# Altium footprint library DrPCB.PcbLib: 910 footprints (part 22 of 57)
Each footprint in its own frame and in the unit in brackets; x right, y up, seen from the top. Pads: shape width x height; smd on the part's side, far side on the other; paste and mask are expansions set on the pad; w line width, h text height; cw(c..) or ccw(c..) is an arc to the next point about the centre after c.
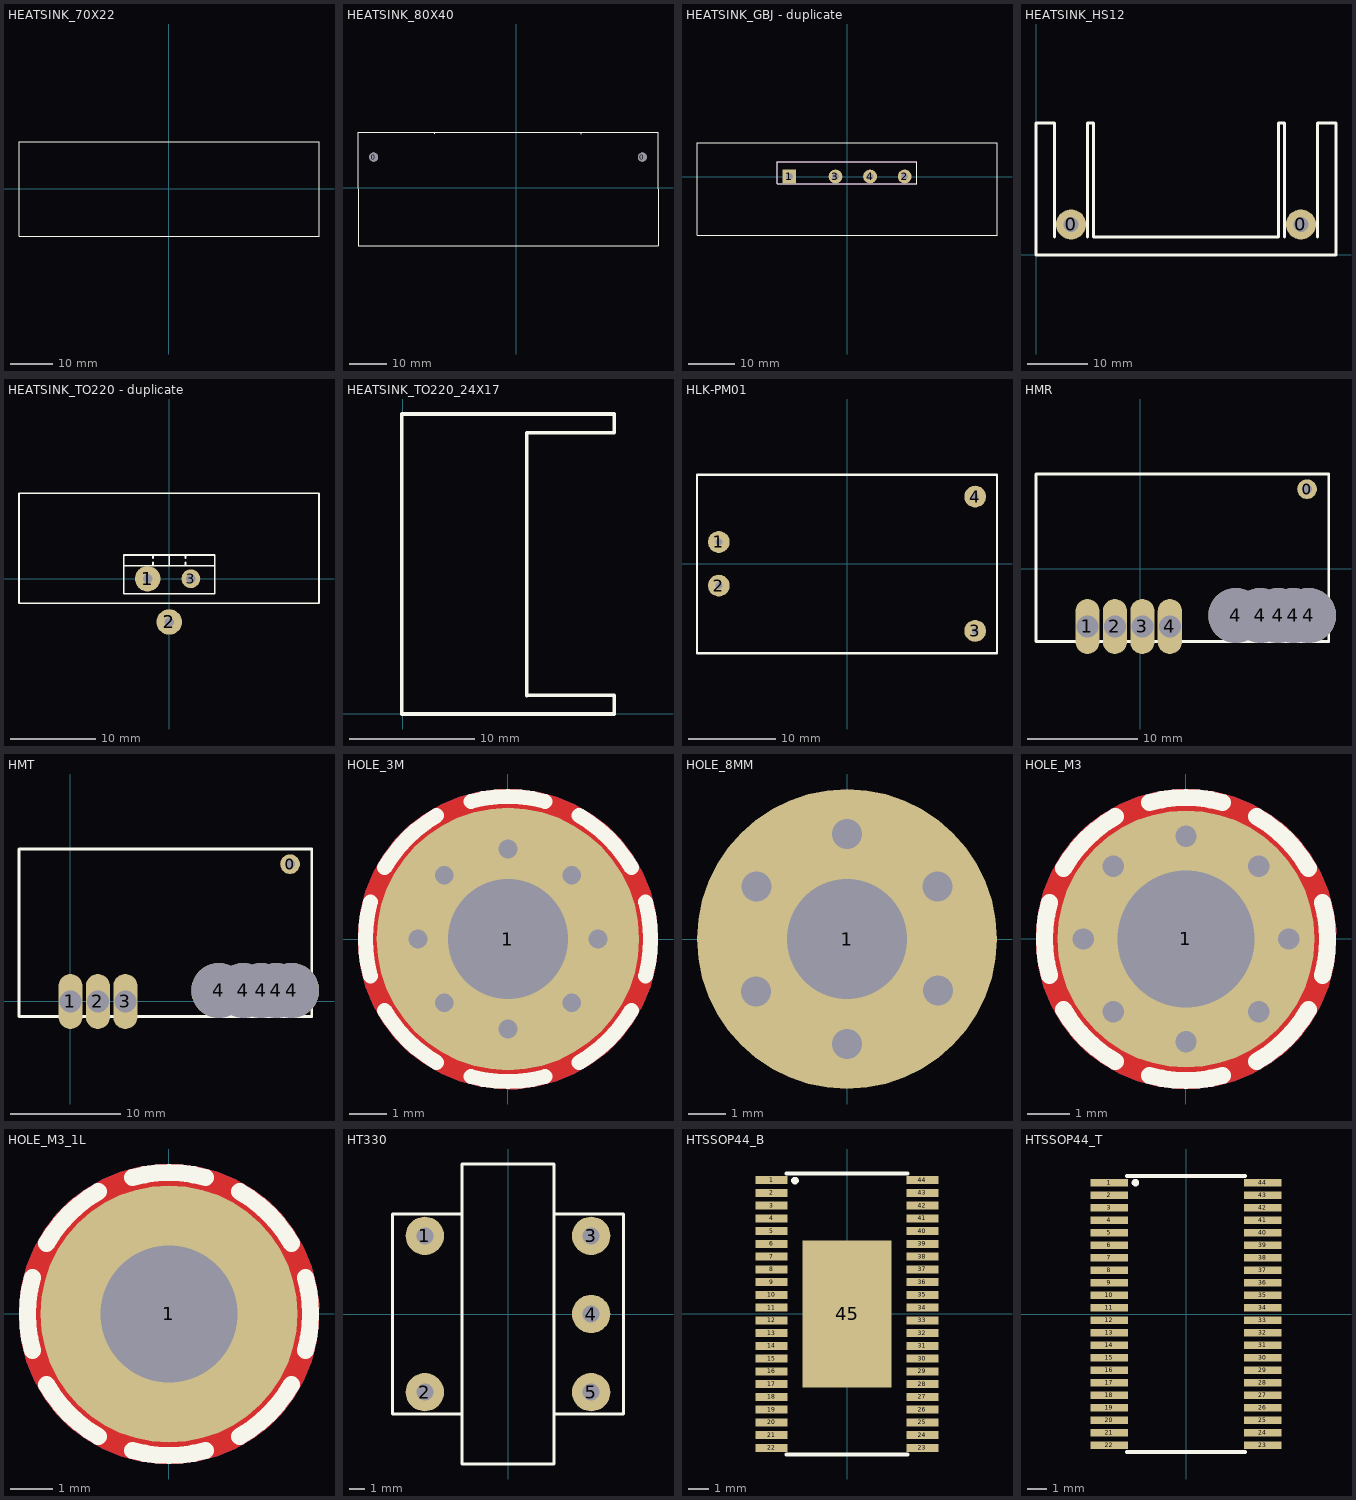
[diagram p21: the footprints below, top view; thin cyan lines are the x and y axes]

## HEATSINK_70X22 [mm]
Top Overlay:
  lines w0.15: -35,-11 35,-11 35,11 -35,11 -35,-11
3D body "Heatsink.STEP": height 4.7, standoff 1.5, extent -35,-11 35,11

## HEATSINK_80X40 [mm]
pads (2):
  round 2.4 hole 2.4: 0(-38.16,8.115) 0(33.642,8.115)
Top Overlay:
  lines w0.2: -42.364,-15.494 37.833,-15.494 37.833,14.719 -42.364,14.719 -42.364,-15.49 ; -21.864,14.338 -21.864,14.719 ; 17.333,14.313 17.333,14.694
3D body "Heatsink3.STEP": height 40, standoff 0, extent -42.261,-15.392 37.739,14.608

## HEATSINK_GBJ - duplicate [mm]
pads (4):
  rect 3x3 hole 1.51: 1(-12.5,0)
  round 3 hole 1.51: 2(12.5,0) 3(-2.5,0) 4(5,0)
Top Overlay:
  lines w0.127: -15.15,-1.55 15.15,-1.55 15.15,3.25 -15.15,3.25 -15.15,-1.55
  lines w0.2: -32.499,-12.7 32.499,-12.7 32.499,7.302 -32.499,7.302 -32.499,-12.7
Mechanical 13:
  lines w0.127: -15.15,-1.55 15.15,-1.55 15.15,3.25 -15.15,3.25 -15.15,-1.55
3D body "step_temp.STEP": height 24.5, standoff -13.8, extent -15,-1.45 15,3.15
3D body "parvaneii.STEP": height 30.01, standoff 0.01, extent -32.5,-12.7 32.5,7.3

## HEATSINK_HS12 [mm]
pads (2):
  round 5 hole 2.5: 0(5.85,5.1) 0(44.15,5.1)
Top Overlay:
  lines w0.5: 3.088,3 3.088,22 0,22 0,0 50,0 50,22 46.912,22 46.912,3 ; 8.611,3 8.611,22 9.611,22 9.611,3 ; 9.649,3 40.4,3 40.4,22 41.4,22 41.4,3
3D body: height 25, standoff 0, extent 0.013,0.013 49.987,22.009

## HEATSINK_TO220 - duplicate [mm]
pads (3):
  round 3 hole 1.1: 1(-2.54,0) 2(0,-5.08)
  round 2.2 hole 1.1: 3(2.54,0)
Top Overlay:
  lines w0.2: -17.645,-2.894 17.585,-2.894 17.585,10.035 -17.645,10.035 ; -17.645,-2.881 -17.645,10.022 ; -5.334,1.524 5.334,1.524 ; -1.905,1.524 -1.905,1.905 ; -1.905,2.413 -1.905,2.794 ; 0,1.524 0,2.794 ; 1.905,1.524 1.905,1.905 ; 1.905,2.413 1.905,2.794 ; -5.334,-1.778 5.334,-1.778 5.334,2.794 -5.334,2.794 -5.334,-1.778
3D body "v7477w2.stp": height 25.41, standoff -3.49, extent -17.529,-2.783 17.471,9.917
3D body "User Library-TO220-2_V-S.STEP": height 19.3, standoff -2.9, extent -5.03,-1.706 4.97,2.794

## HEATSINK_TO220_24X17 [mm]
Top Overlay:
  lines w0.3: 9.924,1.462 16.924,1.462 16.924,-0.038 -0.076,-0.038 -0.076,23.962 16.924,23.962 16.924,22.462 ; 9.929,1.448 9.929,22.428 9.963,22.462 ; 9.929,22.462 16.929,22.462
3D body "User Library-radiator_l298.STEP": height 25, standoff -4, extent 0.66,-0.037 16.66,23.963

## HLK-PM01 [mm]
pads (4):
  round 2.5 hole 0.8: 1(-14.7,2.5) 2(-14.7,-2.5) 3(14.7,-7.7) 4(14.7,7.7)
Top Overlay:
  lines w0.254: -17.2,-10.25 17.2,-10.25 17.2,10.15 ; -17.2,-10.2 -17.2,10.2 17.2,10.2
3D body "User Library-HLK-PM01.step": height 15.11, standoff -4.99, extent -17,-10.15 17,10.05

## HMR [mm]
pads (10):
  round 1.8 hole 0.9: 0(15.196,7.25)
  oval 2.2x5 hole 2: 1(-4.804,-5.25) 2(-2.304,-5.25) 3(0.196,-5.25) 4(2.696,-5.25)
  round 5 hole 5: 4(8.696,-4.25) 4(10.939,-4.25) 4(12.556,-4.25) 4(13.941,-4.25) 4(15.328,-4.25)
Top Overlay:
  lines w0.254: -9.489,-6.624 -9.489,8.622 17.164,8.622 17.164,-6.624 -9.489,-6.624

## HMT [mm]
pads (9):
  round 1.8 hole 0.9: 0(20,12.5)
  oval 2.2x5 hole 2: 1(0,0) 2(2.5,0) 3(5,0)
  round 5 hole 5: 4(13.5,1) 4(15.743,1) 4(17.36,1) 4(18.745,1) 4(20.132,1)
Top Overlay:
  lines w0.254: -4.685,-1.374 21.968,-1.374 21.968,13.872 -4.685,13.872 -4.685,-1.374

## HOLE_3M [mm] "SCREW mouting, M3, 3.0mm diameter and 6.0mm FlangeHead"
pads (1):
  round 7 / inner round 3.5 / far side round 7 hole 3.2 mask+0.1: 1(0,0)
via 0,2.4 diameter 0.8 hole 0.5
via 0,-2.4 diameter 0.8 hole 0.5
via 1.697,-1.697 diameter 0.8 hole 0.5
via -1.697,1.697 diameter 0.8 hole 0.5
via 2.4,0 diameter 0.8 hole 0.5
via -2.4,0 diameter 0.8 hole 0.5
via 1.697,1.697 diameter 0.8 hole 0.5
via -1.697,-1.697 diameter 0.8 hole 0.5
Top Layer:
  pour cut-out: 0,4 -0.262,4 -0.782,3.932 -1.288,3.796 -1.773,3.595 -2.227,3.333 -2.643,3.014 -3.014,2.643 -3.333,2.227 -3.595,1.773 -3.796,1.289 -3.931,0.782 -4,0.262 -4,0 -4,-0.262 -3.931,-0.782 -3.796,-1.288 -3.595,-1.773 -3.333,-2.227 -3.014,-2.643 -2.643,-3.014 -2.227,-3.333 -1.773,-3.595 -1.288,-3.796 -0.782,-3.931 -0.262,-4 0,-4 0.262,-4 0.782,-3.932 1.289,-3.796 1.773,-3.595 2.227,-3.333 2.643,-3.014 3.014,-2.643 3.333,-2.227 3.595,-1.773 3.796,-1.289 3.932,-0.782 4,-0.262 4,0 4,0.262 3.932,0.782 3.796,1.289 3.595,1.773 3.333,2.227 3.014,2.643 2.643,3.014 2.227,3.333 1.773,3.595 1.289,3.796 0.782,3.932 0.262,4
Bottom Layer:
  pour cut-out: 0,4 -0.262,4 -0.782,3.932 -1.288,3.796 -1.773,3.595 -2.227,3.333 -2.643,3.014 -3.014,2.643 -3.333,2.227 -3.595,1.773 -3.796,1.289 -3.931,0.782 -4,0.262 -4,0 -4,-0.262 -3.931,-0.782 -3.796,-1.288 -3.595,-1.773 -3.333,-2.227 -3.014,-2.643 -2.643,-3.014 -2.227,-3.333 -1.773,-3.595 -1.288,-3.796 -0.782,-3.931 -0.262,-4 0,-4 0.262,-4 0.782,-3.932 1.289,-3.796 1.773,-3.595 2.227,-3.333 2.643,-3.014 3.014,-2.643 3.333,-2.227 3.595,-1.773 3.796,-1.289 3.932,-0.782 4,-0.262 4,0 4,0.262 3.932,0.782 3.796,1.289 3.595,1.773 3.333,2.227 3.014,2.643 2.643,3.014 2.227,3.333 1.773,3.595 1.289,3.796 0.782,3.932 0.262,4
Top Overlay:
  lines w0.4: -3.671,-0.984 cw(c0,0) -3.671,0.984 ; -3.291,-1.9 ccw(c0,0) -1.9,-3.291 ; -3.291,1.9 cw(c0,0) -1.9,3.291 ; -0.984,-3.671 ccw(c0,0) 0.984,-3.671 ; -0.984,3.671 cw(c0,0) 0.984,3.671 ; 1.9,-3.291 ccw(c0,0) 3.291,-1.9 ; 1.9,3.291 cw(c0,0) 3.291,1.9 ; 3.671,-0.984 ccw(c0,0) 3.671,0.984

## HOLE_8MM [mm]
pads (1):
  round 8 hole 3.2: 1(0,0)
via -2.42,1.404 diameter 0.8 hole 0.8
via -2.426,-1.394 diameter 0.8 hole 0.8
via 2.426,-1.378 diameter 0.8 hole 0.8
via 2.42,1.397 diameter 0.8 hole 0.8
via 0,-2.8 diameter 0.8 hole 0.8
via 0,2.8 diameter 0.8 hole 0.8

## HOLE_M3 [mm] "SCREW mouting, M3, 3.0mm diameter and 6.0mm PanHead"
pads (1):
  round 6 / inner round 3.5 / far side round 6 hole 3.2 mask+0.1: 1(0,0)
via -1.697,-1.697 diameter 0.8 hole 0.5
via 1.697,1.697 diameter 0.8 hole 0.5
via -2.4,0 diameter 0.8 hole 0.5
via 2.4,0 diameter 0.8 hole 0.5
via -1.697,1.697 diameter 0.8 hole 0.5
via 1.697,-1.697 diameter 0.8 hole 0.5
via 0,-2.4 diameter 0.8 hole 0.5
via 0,2.4 diameter 0.8 hole 0.5
Top Layer:
  pour cut-out: 0,3.5 -0.229,3.5 -0.684,3.44 -1.127,3.321 -1.551,3.146 -1.949,2.916 -2.313,2.637 -2.637,2.313 -2.916,1.949 -3.146,1.551 -3.321,1.127 -3.44,0.684 -3.5,0.229 -3.5,0 -3.5,-0.229 -3.44,-0.684 -3.321,-1.127 -3.146,-1.551 -2.916,-1.949 -2.637,-2.313 -2.313,-2.637 -1.949,-2.916 -1.551,-3.146 -1.127,-3.321 -0.684,-3.44 -0.229,-3.5 0,-3.5 0.229,-3.5 0.684,-3.44 1.127,-3.321 1.551,-3.146 1.949,-2.916 2.313,-2.637 2.637,-2.313 2.916,-1.949 3.146,-1.551 3.321,-1.127 3.44,-0.684 3.5,-0.229 3.5,0 3.5,0.229 3.44,0.684 3.321,1.127 3.146,1.551 2.916,1.949 2.637,2.313 2.313,2.637 1.949,2.916 1.551,3.146 1.127,3.321 0.684,3.44 0.229,3.5
Bottom Layer:
  pour cut-out: 0,3.5 -0.229,3.5 -0.684,3.44 -1.127,3.321 -1.551,3.146 -1.949,2.916 -2.313,2.637 -2.637,2.313 -2.916,1.949 -3.146,1.551 -3.321,1.127 -3.44,0.684 -3.5,0.229 -3.5,0 -3.5,-0.229 -3.44,-0.684 -3.321,-1.127 -3.146,-1.551 -2.916,-1.949 -2.637,-2.313 -2.313,-2.637 -1.949,-2.916 -1.551,-3.146 -1.127,-3.321 -0.684,-3.44 -0.229,-3.5 0,-3.5 0.229,-3.5 0.684,-3.44 1.127,-3.321 1.551,-3.146 1.949,-2.916 2.313,-2.637 2.637,-2.313 2.916,-1.949 3.146,-1.551 3.321,-1.127 3.44,-0.684 3.5,-0.229 3.5,0 3.5,0.229 3.44,0.684 3.321,1.127 3.146,1.551 2.916,1.949 2.637,2.313 2.313,2.637 1.949,2.916 1.551,3.146 1.127,3.321 0.684,3.44 0.229,3.5
Top Overlay:
  lines w0.4: -3.188,-0.854 cw(c0,0) -3.188,0.854 ; -2.858,-1.65 ccw(c0,0) -1.65,-2.858 ; -2.858,1.65 cw(c0,0) -1.65,2.858 ; -0.854,-3.188 ccw(c0,0) 0.854,-3.188 ; -0.854,3.188 cw(c0,0) 0.854,3.188 ; 1.65,-2.858 ccw(c0,0) 2.858,-1.65 ; 1.65,2.858 cw(c0,0) 2.858,1.65 ; 3.188,-0.854 ccw(c0,0) 3.188,0.854

## HOLE_M3_1L [mm] "SCREW mouting, M3, 3.0mm diameter and 6.0mm PanHead"
pads (1):
  round 6 / inner round 3.5 / far side round 6 hole 3.2 mask+0.1: 1(0,0)
Top Layer:
  pour cut-out: 0,3.5 -0.229,3.5 -0.684,3.44 -1.127,3.321 -1.551,3.146 -1.949,2.916 -2.313,2.637 -2.637,2.313 -2.916,1.949 -3.146,1.551 -3.321,1.127 -3.44,0.684 -3.5,0.229 -3.5,0 -3.5,-0.229 -3.44,-0.684 -3.321,-1.127 -3.146,-1.551 -2.916,-1.949 -2.637,-2.313 -2.313,-2.637 -1.949,-2.916 -1.551,-3.146 -1.127,-3.321 -0.684,-3.44 -0.229,-3.5 0,-3.5 0.229,-3.5 0.684,-3.44 1.127,-3.321 1.551,-3.146 1.949,-2.916 2.313,-2.637 2.637,-2.313 2.916,-1.949 3.146,-1.551 3.321,-1.127 3.44,-0.684 3.5,-0.229 3.5,0 3.5,0.229 3.44,0.684 3.321,1.127 3.146,1.551 2.916,1.949 2.637,2.313 2.313,2.637 1.949,2.916 1.551,3.146 1.127,3.321 0.684,3.44 0.229,3.5
Bottom Layer:
  pour cut-out: 0,3.5 -0.229,3.5 -0.684,3.44 -1.127,3.321 -1.551,3.146 -1.949,2.916 -2.313,2.637 -2.637,2.313 -2.916,1.949 -3.146,1.551 -3.321,1.127 -3.44,0.684 -3.5,0.229 -3.5,0 -3.5,-0.229 -3.44,-0.684 -3.321,-1.127 -3.146,-1.551 -2.916,-1.949 -2.637,-2.313 -2.313,-2.637 -1.949,-2.916 -1.551,-3.146 -1.127,-3.321 -0.684,-3.44 -0.229,-3.5 0,-3.5 0.229,-3.5 0.684,-3.44 1.127,-3.321 1.551,-3.146 1.949,-2.916 2.313,-2.637 2.637,-2.313 2.916,-1.949 3.146,-1.551 3.321,-1.127 3.44,-0.684 3.5,-0.229 3.5,0 3.5,0.229 3.44,0.684 3.321,1.127 3.146,1.551 2.916,1.949 2.637,2.313 2.313,2.637 1.949,2.916 1.551,3.146 1.127,3.321 0.684,3.44 0.229,3.5
Top Overlay:
  lines w0.4: -3.188,-0.854 cw(c0,0) -3.188,0.854 ; -2.858,-1.65 ccw(c0,0) -1.65,-2.858 ; -2.858,1.65 cw(c0,0) -1.65,2.858 ; -0.854,-3.188 ccw(c0,0) 0.854,-3.188 ; -0.854,3.188 cw(c0,0) 0.854,3.188 ; 1.65,-2.858 ccw(c0,0) 2.858,-1.65 ; 1.65,2.858 cw(c0,0) 2.858,1.65 ; 3.188,-0.854 ccw(c0,0) 3.188,0.854

## HT330 [mm]
pads (5):
  round 2.5 hole 1.1: 1(-5.4,5.08) 2(-5.4,-5.08) 3(5.4,5.08) 4(5.4,0) 5(5.4,-5.08)
Top Overlay:
  lines w0.2: -3.01,-6.5 -7.5,-6.5 -7.5,6.5 -3.01,6.5 ; 3.01,-6.5 7.5,-6.5 7.5,6.5 3.01,6.5 ; -3,-9.75 -3,9.75 3,9.75 3,-9.75 -3,-9.75

## HTSSOP44_B [mm]
pads (45):
  rect 1.6x0.4 smd: 1(-3.75,6.667) 2(-3.75,6.033) 3(-3.75,5.398) 4(-3.75,4.763) 5(-3.75,4.128) 6(-3.75,3.493) 7(-3.75,2.858) 8(-3.75,2.223) 9(-3.75,1.588) 10(-3.75,0.953) 11(-3.75,0.318) 12(-3.75,-0.318) 13(-3.75,-0.953) 14(-3.75,-1.588) 15(-3.75,-2.223) 16(-3.75,-2.858) 17(-3.75,-3.493) 18(-3.75,-4.128) 19(-3.75,-4.763) 20(-3.75,-5.398) 21(-3.75,-6.033) 22(-3.75,-6.668) 23(3.75,-6.668) 24(3.75,-6.033) 25(3.75,-5.398) 26(3.75,-4.763) 27(3.75,-4.128) 28(3.75,-3.493) 29(3.75,-2.858) 30(3.75,-2.223) 31(3.75,-1.588) 32(3.75,-0.953) 33(3.75,-0.318) 34(3.75,0.318) 35(3.75,0.953) 36(3.75,1.588) 37(3.75,2.223) 38(3.75,2.858) 39(3.75,3.493) 40(3.75,4.128) 41(3.75,4.763) 42(3.75,5.398) 43(3.75,6.033) 44(3.75,6.667)
  rect 4.43x7.3 smd: 45(0,0)
Top Overlay:
  circle w0.254: c-2.591,6.642 r0.064
  lines w0.2: -3,-7 3,-7 ; -3,7 3,7
3D body "User Library-DDV0044D.step": height 1.01, standoff -0.01, extent -4.055,-7 4.055,7

## HTSSOP44_T [mm]
pads (44):
  rect 1.9x0.4 smd: 1(-3.9,6.668) 2(-3.9,6.033) 3(-3.9,5.398) 4(-3.9,4.763) 5(-3.9,4.128) 6(-3.9,3.493) 7(-3.9,2.858) 8(-3.9,2.223) 9(-3.9,1.588) 10(-3.9,0.953) 11(-3.9,0.318) 12(-3.9,-0.317) 13(-3.9,-0.952) 14(-3.9,-1.587) 15(-3.9,-2.222) 16(-3.9,-2.857) 17(-3.9,-3.493) 18(-3.9,-4.128) 19(-3.9,-4.763) 20(-3.9,-5.398) 21(-3.9,-6.033) 22(-3.9,-6.668) 23(3.9,-6.668) 24(3.9,-6.033) 25(3.9,-5.398) 26(3.9,-4.763) 27(3.9,-4.128) 28(3.9,-3.493) 29(3.9,-2.857) 30(3.9,-2.222) 31(3.9,-1.587) 32(3.9,-0.952) 33(3.9,-0.317) 34(3.9,0.318) 35(3.9,0.953) 36(3.9,1.588) 37(3.9,2.223) 38(3.9,2.858) 39(3.9,3.493) 40(3.9,4.128) 41(3.9,4.763) 42(3.9,5.398) 43(3.9,6.033) 44(3.9,6.668)
Top Overlay:
  circle w0.254: c-2.565,6.667 r0.064
  lines w0.2: -3,-7 3,-7 ; -3,7 3,7
3D body "User Library-DDV0044D.step": height 1.01, standoff -0.01, extent -4.055,-7 4.055,7